# Altium integrated library STM32F417 Demo Board.IntLib: 69 symbols (continued)
## Inductor_1
designator L?, comment value 4.7uH  Saturation Current: 2A  (hidden comment: Inductor)
Manufacturer Part Number: NRS5020T4R7MMGJ; Manufacturer: Taiyo Yuden; ComponentLink1Description: Datasheet; ComponentLink1URL: C:\Users\Public\Documents\Altium\env\Datasheets\Inductor\Taiyo Yuden - NRx Series.pdf; ComponentLink2Description: Supplier Link; ComponentLink2URL: https://www.digikey.com/en/products/detail/taiyo-yuden/NRS5020T4R7MMGJ/2230192; Component Category: Inductor; Component Type: Power Inductor; Supplier Link: https://www.digikey.com/en/products/detail/taiyo-yuden/NRS5020T4R7MMGJ/2230192; Supplier Currency: $; Price, Max: $0.07087; Price, Min: $0.18000; Quantity, Max: 87,750; Quantity, Min: 1; Operating Temperature, Max: +120℃; Operating Temperature, Min: -25℃; Supplier Part Number: 587-2890-1-ND; Supplier: Digikey; Package: 5x5x2 mm
footprint Taiyo Yuden - Power Inductor, 4040TK
footprint Taiyo Yuden - Power Inductor, 5050WK
pins: 1, 2

## Logo
designator Logo?  (value not drawn)  (no BOM)
Component Category: Mechanical; Component Type: Logo
footprint Logo 1 (Logo)
text: LOGO

## Mosfet, N-Channel
designator Q?  Current: 100mA  Voltage: 20V  Package: SOT-416FL, SC-89  (hidden comment: Mosfet, N-Channel)
MOSFET, N-CH, 20V, 100mA, SOT-416FL; Manufacturer Part Number: RE1C001UNTCL; Manufacturer: Rohm; Component Category: Transistor; ComponentLink1Description: Datasheet; ComponentLink1URL: C:\Users\Public\Documents\Altium\env\Datasheets\Transistor\Rohm, RE1C001UN.pdf; ComponentLink2Description: Supplier Link; ComponentLink2URL: https://www.digikey.com/en/products/detail/rohm-semiconductor/RE1C001UNTCL/4004557; Supplier: Digikey; Supplier Part Number: RE1C001UNTCLCT-ND; Operating Temperature, Min: *℃; Operating Temperature, Max: *℃; Quantity, Min: 1; Quantity, Max: 15,000; Price, Min: $0.30000; Price, Max: $0.03713; Supplier Currency: $; Supplier Link: https://www.digikey.com/en/products/detail/rohm-semiconductor/RE1C001UNTCL/4004557; Component Type: Mosfet
footprint SOT-416FL, Mosfet - Type 1
pins: D, G, S
1 alternate drawing of the same symbol

## Nexperia, 74LVC4245A
designator IC?  Manufacturer Part Number: 74LVC4245APW,118  Package: TSSOP-24  (hidden comment: Nexperia, 74LVC4245A)
IC, Buffer, Nexperia, TSSOP-24; ComponentLink1Description: Datasheet; ComponentLink1URL: C:\Users\Public\Documents\Altium\env\Datasheets\IC - Buffer\NXP -74LVC4245A.pdf; ComponentLink2Description: Supplier Link; ComponentLink2URL: https://www.digikey.com/en/products/detail/nexperia-usa-inc/74lvc4245apw-118/1231659; Supplier Part Number: 1727-4308-1-ND; Supplier Link: https://www.digikey.com/en/products/detail/nexperia-usa-inc/74lvc4245apw-118/1231659; Supplier Currency: $; Supplier: Digikey; Quantity, Min: 1; Quantity, Max: 1,000; Price, Min: $0.71000; Price, Max: $0.34850; Operating Temperature, Min: -40℃; Operating Temperature, Max: +125℃; Manufacturer: Nexperia; Component Type: Buffer; Component Category: IC
footprint TSSOP-24
pins: 1 VCCA, 2 DIR, 3 A0, 4 A1, 5 A2, 6 A3, 7 A4, 8 A5, 9 A6, 10 A7, 11 GND, 12 GND, 13 GND, 14 B7, 15 B6, 16 B5, 17 B4, 18 B3, 19 B2, 20 B1, 21 B0, 22 #OE, 23 VCCB, 24 VCCB
text: DIR = 1; DIR = 0; VCCA ≥ VCCB

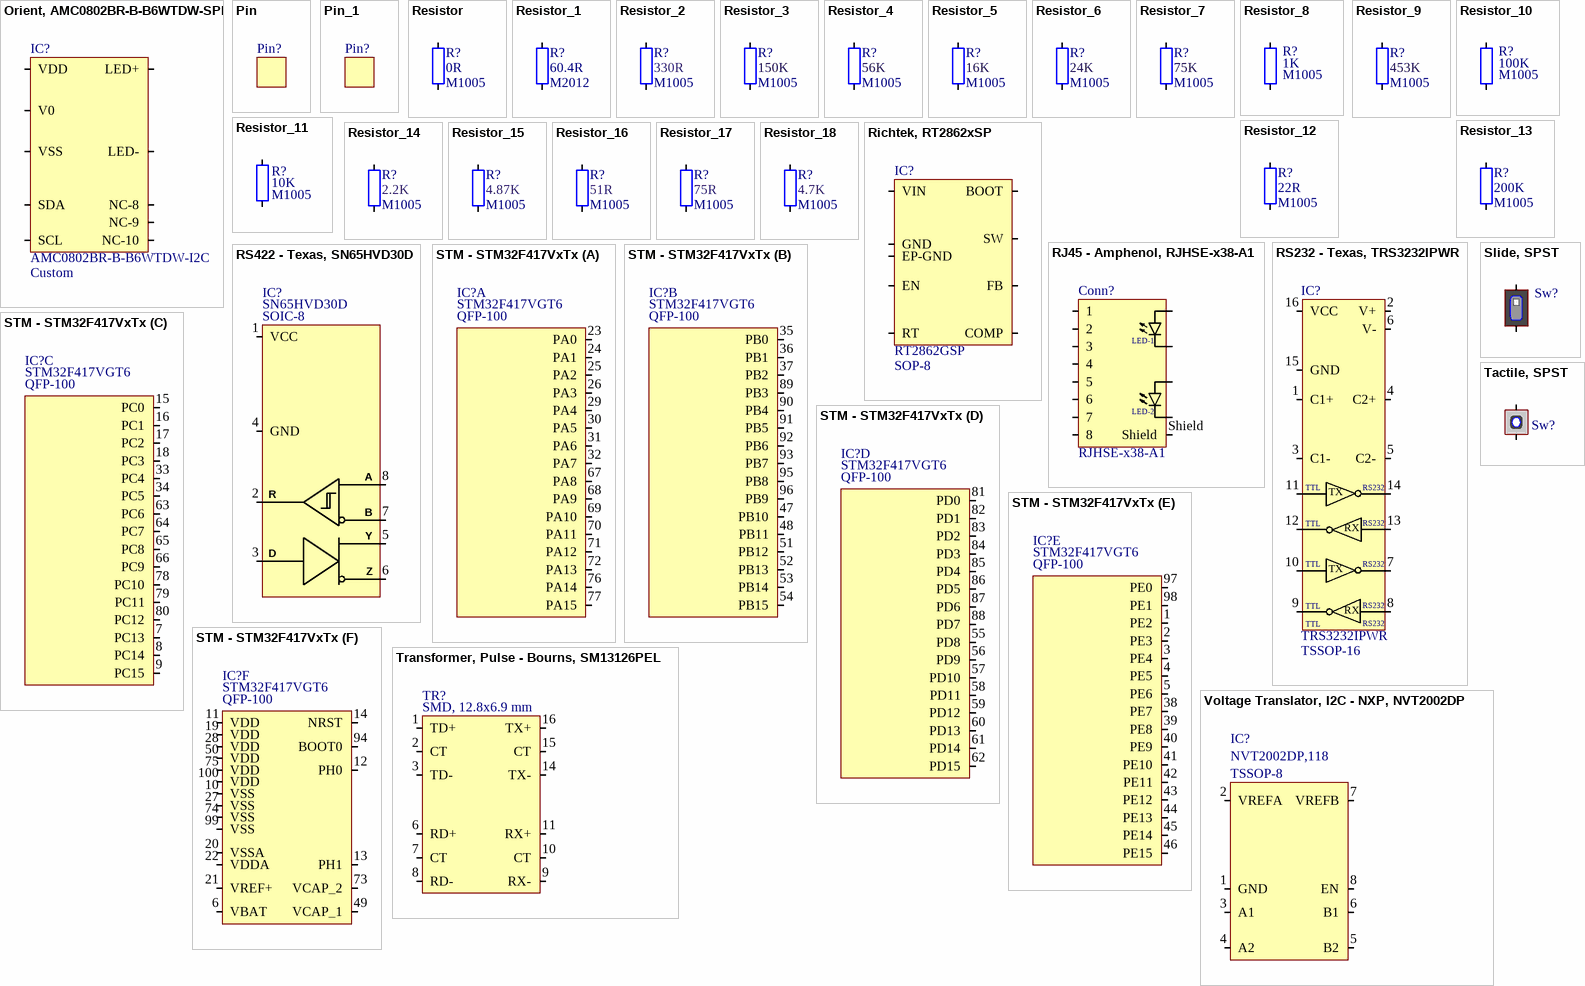
[diagram p1: symbols Orient, AMC0802BR-B-B6WTDW-SPI to Voltage Translator, I2C - NXP, NVT2002DP]

## Orient, AMC0802BR-B-B6WTDW-SPI
designator IC?  Manufacturer Part Number: AMC0802BR-B-B6WTDW-I2C  Package: Custom  (hidden comment: Orient, AMC0802BR-B-B6WTDW-SPI)
Module, LCD, Orient, AMC0802BR-B-B6WTDW-SPI; Manufacturer: Orient Display; ComponentLink1Description: Datasheet; ComponentLink1URL: C:\Users\Public\Documents\Altium\env\Datasheets\Module - LCD\AMC0802BR-B-B6WTDW-SPI.pdf; ComponentLink2Description: Supplier Link; ComponentLink2URL: https://www.digikey.com/en/products/detail/orient-display/amc0802br-b-b6wtdw-i2c/22531884; Supplier Part Number: 5491-AMC0802BR-B-B6WTDW-I2C-ND; Supplier Link: https://www.digikey.com/en/products/detail/orient-display/amc0802br-b-b6wtdw-i2c/22531884; Supplier Currency: $; Supplier: Digikey; Quantity, Min: 1; Quantity, Max: 1,000; Price, Min: $10.32000; Price, Max: $5.74189; Operating Temperature, Min: -20℃; Operating Temperature, Max: +70℃; Component Type: Module; Component Category: LCD
footprint Orient, AMC0802BR-B-B6WTDW-SPI (Module, LCD, Orient, AMC0802BR-B-B6WTDW-SPI)
pins: LED+, LED-, NC-8, NC-9, NC-10, SCL, SDA, V0, VDD, VSS

## Pin
designator Pin?  (value not drawn)
Manufacturer: JST; Manufacturer Part Number: SPND-001T-C0.5; Component Category: Connector; ComponentLink1Description: Datasheet; ComponentLink1URL: C:\Users\Public\Documents\Altium\env\Datasheets\Connector\SPHD-001T-P0.5.pdf; ComponentLink2Description: Supplier Link; ComponentLink2URL: https://www.digikey.com/en/products/detail/jst-sales-america-inc/SPND-001T-C0-5/1788519; Supplier Part Number: 455-2303-1-ND; Supplier Link: https://www.digikey.com/en/products/detail/jst-sales-america-inc/SPND-001T-C0-5/1788519; Supplier Currency: $; Supplier: Digikey; Quantity, Min: 1,000; Quantity, Max: *; Price, Min: $0.02410; Price, Max: $*; Operating Temperature, Min: *℃; Operating Temperature, Max: *℃; Component Type: PCB; Package: Pin
footprint Pin, SPHD-001T-P0.5
footprint Pin, SPND-001T-C0.5
footprint Pin, SXA-001T-P0.6

## Pin_1
designator Pin?, comment Pin  (value not drawn)
Pin, JST, SXA-001T-P0.6; Component Category: Connector; ComponentLink1Description: Datasheet; ComponentLink1URL: C:\Users\Public\Documents\Altium\env\Datasheets\Connector\SPHD-001T-P0.5.pdf; ComponentLink2Description: Supplier Link; ComponentLink2URL: https://www.digikey.com/en/products/detail/jst-sales-america-inc/SXA-001T-P0-6/923775; Supplier Part Number: 455-1904-1-ND; Supplier Link: https://www.digikey.com/en/products/detail/jst-sales-america-inc/SXA-001T-P0-6/923775; Supplier Currency: $; Supplier: Digikey; Quantity, Min: 8,000; Quantity, Max: 800,000; Price, Min: $0.01620; Price, Max: $0.01171; Operating Temperature, Min: *℃; Operating Temperature, Max: *℃; Manufacturer: JST; Component Type: PCB; Package: Housing; Manufacturer Part Number: SXA-001T-P0.6
footprint Pin, SPHD-001T-P0.5
footprint Pin, SPND-001T-C0.5
footprint Pin, SXA-001T-P0.6

## Resistor
designator R?  value 0R  Package: M1005  (hidden comment: Resistor)
Manufacturer: Yageo; Manufacturer Part Number: RC0402FR-070RL; Supplier: Digikey; Supplier Part Number: 311-0.0LRCT-ND; Operating Temperature, Min: -55℃; Operating Temperature, Max: +155℃; Quantity, Min: 1; Quantity, Max: 250000; Price, Min: $0.10000; Price, Max: $0.00133; Supplier Currency: $; Supplier Link: https://www.digikey.com/en/products/detail/yageo/RC0402FR-070RL/2827570; Tolerance: *; Component Type: Fixed Value; Component Category: Resistor; ComponentLink1Description: Datasheet; ComponentLink1URL: C:\Users\Public\Documents\Altium\env\Datasheets\Resistor\Yageo - RC_L Series.pdf; ComponentLink2Description: Supplier Link; ComponentLink2URL: https://www.digikey.com/en/products/detail/yageo/RC0402FR-070RL/2827570
footprint Resistor_SMD_M603_I0201 (Resistor, SMD, M603, I0201)
footprint Resistor_SMD_M1005_I0402 (Resistor, SMD, M1005, I0402)
footprint Resistor_SMD_M1608_I0603 (Resistor, SMD, M1608, I0603)
footprint Resistor_SMD_M2012_I0805 (Resistor, SMD, M2012, I0805)
footprint Resistor_SMD_M3216_I1206 (Resistor, SMD, M3216, I1206)
footprint Resistor_SMD_M5025_I2010 (Resistor, SMD, M5025, I2010)
footprint Resistor_SMD_M6332_I2512 (Resistor, SMD, M1332, I2512)
footprint Resistor_SMD_M3246_I1812 (Resistor, SMD, M3246, I1812)
footprint Resistor_SMD_M3225_I1210 (Resistor, SMD, M3225, I1210)
pins: 1, 2
1 alternate drawing of the same symbol

## Resistor_1
designator R?, comment value 60.4R  Package: M2012  (hidden comment: Resistor)
Res, 60.4R, 1%, M2012; Manufacturer: Yageo; Manufacturer Part Number: RC0805FR-0760R4L; Supplier: Digikey; Supplier Part Number: 311-60.4CRCT-ND; Operating Temperature, Min: -55℃; Operating Temperature, Max: +155℃; Quantity, Min: 1; Quantity, Max: 10,000; Price, Min: $0.10000; Price, Max: $0.00357; Supplier Currency: $; Supplier Link: https://www.digikey.com/en/products/detail/yageo/RC0805FR-0760R4L/728073; Tolerance: 1%; Component Type: Fixed Value; Component Category: Resistor; ComponentLink1Description: Datasheet; ComponentLink1URL: C:\Users\Public\Documents\Altium\env\Datasheets\Resistor\Yageo - RC_L Series.pdf; ComponentLink2Description: Supplier Link; ComponentLink2URL: https://www.digikey.com/en/products/detail/yageo/RC0805FR-0760R4L/728073
footprint Resistor_SMD_M603_I0201 (Resistor, SMD, M603, I0201)
footprint Resistor_SMD_M1005_I0402 (Resistor, SMD, M1005, I0402)
footprint Resistor_SMD_M1608_I0603 (Resistor, SMD, M1608, I0603)
footprint Resistor_SMD_M2012_I0805 (Resistor, SMD, M2012, I0805)
footprint Resistor_SMD_M3216_I1206 (Resistor, SMD, M3216, I1206)
footprint Resistor_SMD_M5025_I2010 (Resistor, SMD, M5025, I2010)
footprint Resistor_SMD_M6332_I2512 (Resistor, SMD, M1332, I2512)
footprint Resistor_SMD_M3246_I1812 (Resistor, SMD, M3246, I1812)
footprint Resistor_SMD_M3225_I1210 (Resistor, SMD, M3225, I1210)
pins: 1, 2
1 alternate drawing of the same symbol

## Resistor_2
designator R?, comment value 330R  Package: M1005  (hidden comment: Resistor)
Res, 330R, 1%, M1005; Manufacturer: Yageo; Manufacturer Part Number: RC0402FR-07330RL; Supplier: Digikey; Supplier Part Number: 311-330LRCT-ND; Operating Temperature, Min: -55℃; Operating Temperature, Max: +155℃; Quantity, Min: 1; Quantity, Max: 250,000; Price, Min: $0.10000; Price, Max: $0.00181; Supplier Currency: $; Supplier Link: https://www.digikey.com/en/products/detail/yageo/RC0402FR-07330RL/726594; Tolerance: 1%; Component Type: Fixed Value; Component Category: Resistor; ComponentLink1Description: Datasheet; ComponentLink1URL: C:\Users\Public\Documents\Altium\env\Datasheets\Resistor\Yageo - RC_L Series.pdf; ComponentLink2Description: Supplier Link; ComponentLink2URL: https://www.digikey.com/en/products/detail/yageo/RC0402FR-07330RL/726594
footprint Resistor_SMD_M603_I0201 (Resistor, SMD, M603, I0201)
footprint Resistor_SMD_M1005_I0402 (Resistor, SMD, M1005, I0402)
footprint Resistor_SMD_M1608_I0603 (Resistor, SMD, M1608, I0603)
footprint Resistor_SMD_M2012_I0805 (Resistor, SMD, M2012, I0805)
footprint Resistor_SMD_M3216_I1206 (Resistor, SMD, M3216, I1206)
footprint Resistor_SMD_M5025_I2010 (Resistor, SMD, M5025, I2010)
footprint Resistor_SMD_M6332_I2512 (Resistor, SMD, M1332, I2512)
footprint Resistor_SMD_M3246_I1812 (Resistor, SMD, M3246, I1812)
footprint Resistor_SMD_M3225_I1210 (Resistor, SMD, M3225, I1210)
pins: 1, 2
1 alternate drawing of the same symbol

## Resistor_3
designator R?, comment value 150K  Package: M1005  (hidden comment: Resistor)
Res, 150K, 1%, M1005; Manufacturer: Yageo; Manufacturer Part Number: RC0402FR-07150KL; Supplier: Digikey; Supplier Part Number: 311-150KLRCT-ND; Operating Temperature, Min: -55℃; Operating Temperature, Max: +155℃; Quantity, Min: 1; Quantity, Max: 250,000; Price, Min: $0.11000; Price, Max: $0.00181; Supplier Currency: $; Supplier Link: https://www.digikey.com/en/products/detail/yageo/RC0402FR-07150KL/726542; Tolerance: 1%; Component Type: Fixed Value; Component Category: Resistor; ComponentLink1Description: Datasheet; ComponentLink1URL: C:\Users\Public\Documents\Altium\env\Datasheets\Resistor\Yageo - RC_L Series.pdf; ComponentLink2Description: Supplier Link; ComponentLink2URL: https://www.digikey.com/en/products/detail/yageo/RC0402FR-07150KL/726542
footprint Resistor_SMD_M603_I0201 (Resistor, SMD, M603, I0201)
footprint Resistor_SMD_M1005_I0402 (Resistor, SMD, M1005, I0402)
footprint Resistor_SMD_M1608_I0603 (Resistor, SMD, M1608, I0603)
footprint Resistor_SMD_M2012_I0805 (Resistor, SMD, M2012, I0805)
footprint Resistor_SMD_M3216_I1206 (Resistor, SMD, M3216, I1206)
footprint Resistor_SMD_M5025_I2010 (Resistor, SMD, M5025, I2010)
footprint Resistor_SMD_M6332_I2512 (Resistor, SMD, M1332, I2512)
footprint Resistor_SMD_M3246_I1812 (Resistor, SMD, M3246, I1812)
footprint Resistor_SMD_M3225_I1210 (Resistor, SMD, M3225, I1210)
pins: 1, 2
1 alternate drawing of the same symbol

## Resistor_4
designator R?, comment value 56K  Package: M1005  (hidden comment: Resistor)
Res, 56K, 1%, M1005; Manufacturer: Yageo; Manufacturer Part Number: RC0402FR-0756KL; Supplier: Digikey; Supplier Part Number: 311-56.0KLRCT-ND; Operating Temperature, Min: -55℃; Operating Temperature, Max: +155℃; Quantity, Min: 1; Quantity, Max: 250,000; Price, Min: $0.10000; Price, Max: $0.00181; Supplier Currency: $; Supplier Link: https://www.digikey.com/en/products/detail/yageo/RC0402FR-0756KL/726635; Tolerance: 1%; Component Type: Fixed Value; Component Category: Resistor; ComponentLink1Description: Datasheet; ComponentLink1URL: C:\Users\Public\Documents\Altium\env\Datasheets\Resistor\Yageo - RC_L Series.pdf; ComponentLink2Description: Supplier Link; ComponentLink2URL: https://www.digikey.com/en/products/detail/yageo/RC0402FR-0756KL/726635
footprint Resistor_SMD_M603_I0201 (Resistor, SMD, M603, I0201)
footprint Resistor_SMD_M1005_I0402 (Resistor, SMD, M1005, I0402)
footprint Resistor_SMD_M1608_I0603 (Resistor, SMD, M1608, I0603)
footprint Resistor_SMD_M2012_I0805 (Resistor, SMD, M2012, I0805)
footprint Resistor_SMD_M3216_I1206 (Resistor, SMD, M3216, I1206)
footprint Resistor_SMD_M5025_I2010 (Resistor, SMD, M5025, I2010)
footprint Resistor_SMD_M6332_I2512 (Resistor, SMD, M1332, I2512)
footprint Resistor_SMD_M3246_I1812 (Resistor, SMD, M3246, I1812)
footprint Resistor_SMD_M3225_I1210 (Resistor, SMD, M3225, I1210)
pins: 1, 2
1 alternate drawing of the same symbol

## Resistor_5
designator R?, comment value 16K  Package: M1005  (hidden comment: Resistor)
Res, 16K, 1%, M1005; Manufacturer: Yageo; Manufacturer Part Number: RC0402FR-0716KL; Supplier: Digikey; Supplier Part Number: 311-16.0KLRCT-ND; Operating Temperature, Min: -55℃; Operating Temperature, Max: +155℃; Quantity, Min: 1; Quantity, Max: 10,000; Price, Min: $0.10000; Price, Max: $0.00127; Supplier Currency: $; Supplier Link: https://www.digikey.com/en/products/detail/yageo/RC0402FR-0716KL/726544; Tolerance: 1%; Component Type: Fixed Value; Component Category: Resistor; ComponentLink1Description: Datasheet; ComponentLink1URL: C:\Users\Public\Documents\Altium\env\Datasheets\Resistor\Yageo - RC_L Series.pdf; ComponentLink2Description: Supplier Link; ComponentLink2URL: https://www.digikey.com/en/products/detail/yageo/RC0402FR-0716KL/726544
footprint Resistor_SMD_M603_I0201 (Resistor, SMD, M603, I0201)
footprint Resistor_SMD_M1005_I0402 (Resistor, SMD, M1005, I0402)
footprint Resistor_SMD_M1608_I0603 (Resistor, SMD, M1608, I0603)
footprint Resistor_SMD_M2012_I0805 (Resistor, SMD, M2012, I0805)
footprint Resistor_SMD_M3216_I1206 (Resistor, SMD, M3216, I1206)
footprint Resistor_SMD_M5025_I2010 (Resistor, SMD, M5025, I2010)
footprint Resistor_SMD_M6332_I2512 (Resistor, SMD, M1332, I2512)
footprint Resistor_SMD_M3246_I1812 (Resistor, SMD, M3246, I1812)
footprint Resistor_SMD_M3225_I1210 (Resistor, SMD, M3225, I1210)
pins: 1, 2
1 alternate drawing of the same symbol

## Resistor_6
designator R?, comment value 24K  Package: M1005  (hidden comment: Resistor)
Res, 24K, 1%, M1005; Manufacturer: Yageo; Manufacturer Part Number: RC0402FR-0724KL; Supplier: Digikey; Supplier Part Number: 311-24KLRCT-ND; Operating Temperature, Min: -55℃; Operating Temperature, Max: +155℃; Quantity, Min: 1; Quantity, Max: 20,000; Price, Min: $0.10000; Price, Max: $0.00153; Supplier Currency: $; Supplier Link: https://www.digikey.com/en/products/detail/yageo/RC0402FR-0724KL/2827581; Tolerance: 1%; Component Type: Fixed Value; Component Category: Resistor; ComponentLink1Description: Datasheet; ComponentLink1URL: C:\Users\Public\Documents\Altium\env\Datasheets\Resistor\Yageo - RC_L Series.pdf; ComponentLink2Description: Supplier Link; ComponentLink2URL: https://www.digikey.com/en/products/detail/yageo/RC0402FR-0724KL/2827581
footprint Resistor_SMD_M603_I0201 (Resistor, SMD, M603, I0201)
footprint Resistor_SMD_M1005_I0402 (Resistor, SMD, M1005, I0402)
footprint Resistor_SMD_M1608_I0603 (Resistor, SMD, M1608, I0603)
footprint Resistor_SMD_M2012_I0805 (Resistor, SMD, M2012, I0805)
footprint Resistor_SMD_M3216_I1206 (Resistor, SMD, M3216, I1206)
footprint Resistor_SMD_M5025_I2010 (Resistor, SMD, M5025, I2010)
footprint Resistor_SMD_M6332_I2512 (Resistor, SMD, M1332, I2512)
footprint Resistor_SMD_M3246_I1812 (Resistor, SMD, M3246, I1812)
footprint Resistor_SMD_M3225_I1210 (Resistor, SMD, M3225, I1210)
pins: 1, 2
1 alternate drawing of the same symbol

## Resistor_7
designator R?, comment value 75K  Package: M1005  (hidden comment: Resistor)
Res, 75K, 1%, M1005; Manufacturer: Yageo; Manufacturer Part Number: RC0402FR-0775KL; Supplier: Digikey; Supplier Part Number: 311-75KLRCT-ND; Operating Temperature, Min: -55℃; Operating Temperature, Max: +155℃; Quantity, Min: 1; Quantity, Max: 250,000; Price, Min: $0.10000; Price, Max: $0.00181; Supplier Currency: $; Supplier Link: https://www.digikey.com/en/products/detail/yageo/RC0402FR-0775KL/2827576; Tolerance: 1%; Component Type: Fixed Value; Component Category: Resistor; ComponentLink1Description: Datasheet; ComponentLink1URL: C:\Users\Public\Documents\Altium\env\Datasheets\Resistor\Yageo - RC_L Series.pdf; ComponentLink2Description: Supplier Link; ComponentLink2URL: https://www.digikey.com/en/products/detail/yageo/RC0402FR-0775KL/2827576
footprint Resistor_SMD_M603_I0201 (Resistor, SMD, M603, I0201)
footprint Resistor_SMD_M1005_I0402 (Resistor, SMD, M1005, I0402)
footprint Resistor_SMD_M1608_I0603 (Resistor, SMD, M1608, I0603)
footprint Resistor_SMD_M2012_I0805 (Resistor, SMD, M2012, I0805)
footprint Resistor_SMD_M3216_I1206 (Resistor, SMD, M3216, I1206)
footprint Resistor_SMD_M5025_I2010 (Resistor, SMD, M5025, I2010)
footprint Resistor_SMD_M6332_I2512 (Resistor, SMD, M1332, I2512)
footprint Resistor_SMD_M3246_I1812 (Resistor, SMD, M3246, I1812)
footprint Resistor_SMD_M3225_I1210 (Resistor, SMD, M3225, I1210)
pins: 1, 2
1 alternate drawing of the same symbol

## Resistor_8
designator R?, comment value 1K  Package: M1005  (hidden comment: Resistor)
Res, 1K, 1%, M1005; Manufacturer: Yageo; Manufacturer Part Number: RC0402FR-071KP; Supplier: Digikey; Supplier Part Number: YAG1254CT-ND; Operating Temperature, Min: -55℃; Operating Temperature, Max: +155℃; Quantity, Min: 1; Quantity, Max: 10,000; Price, Min: $0.10000; Price, Max: $0.00306; Supplier Currency: $; Supplier Link: https://www.digikey.com/en/products/detail/yageo/RC0402FR-071KP/4935269; Tolerance: 1%; Component Type: Fixed Value; Component Category: Resistor; ComponentLink1Description: Datasheet; ComponentLink1URL: C:\Users\Public\Documents\Altium\env\Datasheets\Resistor\Yageo - RC_L Series.pdf; ComponentLink2Description: Supplier Link; ComponentLink2URL: https://www.digikey.com/en/products/detail/yageo/RC0402FR-071KP/4935269
footprint Resistor_SMD_M603_I0201 (Resistor, SMD, M603, I0201)
footprint Resistor_SMD_M1005_I0402 (Resistor, SMD, M1005, I0402)
footprint Resistor_SMD_M1608_I0603 (Resistor, SMD, M1608, I0603)
footprint Resistor_SMD_M2012_I0805 (Resistor, SMD, M2012, I0805)
footprint Resistor_SMD_M3216_I1206 (Resistor, SMD, M3216, I1206)
footprint Resistor_SMD_M5025_I2010 (Resistor, SMD, M5025, I2010)
footprint Resistor_SMD_M6332_I2512 (Resistor, SMD, M1332, I2512)
footprint Resistor_SMD_M3246_I1812 (Resistor, SMD, M3246, I1812)
footprint Resistor_SMD_M3225_I1210 (Resistor, SMD, M3225, I1210)
pins: 1, 2
1 alternate drawing of the same symbol

## Resistor_9
designator R?, comment value 453K  Package: M1005  (hidden comment: Resistor)
Res, 453K, 1%, M1005; Manufacturer: Yageo; Manufacturer Part Number: RC0402FR-07453KL; Supplier: Digikey; Supplier Part Number: YAG3164CT-ND; Operating Temperature, Min: -55℃; Operating Temperature, Max: +155℃; Quantity, Min: 1; Quantity, Max: 10,000; Price, Min: $0.10000; Price, Max: $0.00127; Supplier Currency: $; Supplier Link: https://www.digikey.com/en/products/detail/yageo/RC0402FR-07453KL/5281024; Tolerance: 1%; Component Type: Fixed Value; Component Category: Resistor; ComponentLink1Description: Datasheet; ComponentLink1URL: C:\Users\Public\Documents\Altium\env\Datasheets\Resistor\Yageo - RC_L Series.pdf; ComponentLink2Description: Supplier Link; ComponentLink2URL: https://www.digikey.com/en/products/detail/yageo/RC0402FR-07453KL/5281024
footprint Resistor_SMD_M603_I0201 (Resistor, SMD, M603, I0201)
footprint Resistor_SMD_M1005_I0402 (Resistor, SMD, M1005, I0402)
footprint Resistor_SMD_M1608_I0603 (Resistor, SMD, M1608, I0603)
footprint Resistor_SMD_M2012_I0805 (Resistor, SMD, M2012, I0805)
footprint Resistor_SMD_M3216_I1206 (Resistor, SMD, M3216, I1206)
footprint Resistor_SMD_M5025_I2010 (Resistor, SMD, M5025, I2010)
footprint Resistor_SMD_M6332_I2512 (Resistor, SMD, M1332, I2512)
footprint Resistor_SMD_M3246_I1812 (Resistor, SMD, M3246, I1812)
footprint Resistor_SMD_M3225_I1210 (Resistor, SMD, M3225, I1210)
pins: 1, 2
1 alternate drawing of the same symbol

## Resistor_10
designator R?, comment value 100K  Package: M1005  (hidden comment: Resistor)
Res, 100K, 1%, M1005; Manufacturer: Yageo; Manufacturer Part Number: RC0402FR-07100KP; Supplier: Digikey; Supplier Part Number: 13-RC0402FR-07100KPCT-ND; Operating Temperature, Min: -55℃; Operating Temperature, Max: +155℃; Quantity, Min: 1; Quantity, Max: 10,000; Price, Min: $0.12000; Price, Max: $0.00306; Supplier Currency: $; Supplier Link: https://www.digikey.com/en/products/detail/yageo/RC0402FR-07100KP/12698883; Tolerance: 1%; Component Type: Fixed Value; Component Category: Resistor; ComponentLink1Description: Datasheet; ComponentLink1URL: C:\Users\Public\Documents\Altium\env\Datasheets\Resistor\Yageo - RC_L Series.pdf; ComponentLink2Description: Supplier Link; ComponentLink2URL: https://www.digikey.com/en/products/detail/yageo/RC0402FR-07100KP/12698883
footprint Resistor_SMD_M603_I0201 (Resistor, SMD, M603, I0201)
footprint Resistor_SMD_M1005_I0402 (Resistor, SMD, M1005, I0402)
footprint Resistor_SMD_M1608_I0603 (Resistor, SMD, M1608, I0603)
footprint Resistor_SMD_M2012_I0805 (Resistor, SMD, M2012, I0805)
footprint Resistor_SMD_M3216_I1206 (Resistor, SMD, M3216, I1206)
footprint Resistor_SMD_M5025_I2010 (Resistor, SMD, M5025, I2010)
footprint Resistor_SMD_M6332_I2512 (Resistor, SMD, M1332, I2512)
footprint Resistor_SMD_M3246_I1812 (Resistor, SMD, M3246, I1812)
footprint Resistor_SMD_M3225_I1210 (Resistor, SMD, M3225, I1210)
pins: 1, 2
1 alternate drawing of the same symbol

## Resistor_11
designator R?, comment value 10K  Package: M1005  (hidden comment: Resistor)
Res, 10K, 1%, M1005; Manufacturer: Yageo; Manufacturer Part Number: RC0402FR-0710KP; Supplier: Digikey; Supplier Part Number: YAG1249CT-ND; Operating Temperature, Min: -55℃; Operating Temperature, Max: +155℃; Quantity, Min: 1; Quantity, Max: 250,000; Price, Min: $0.11000; Price, Max: $0.00359; Supplier Currency: $; Supplier Link: https://www.digikey.com/en/products/detail/yageo/RC0402FR-0710KP/4935264; Tolerance: 1%; Component Type: Fixed Value; Component Category: Resistor; ComponentLink1Description: Datasheet; ComponentLink1URL: C:\Users\Public\Documents\Altium\env\Datasheets\Resistor\Yageo - RC_L Series.pdf; ComponentLink2Description: Supplier Link; ComponentLink2URL: https://www.digikey.com/en/products/detail/yageo/RC0402FR-0710KP/4935264
footprint Resistor_SMD_M603_I0201 (Resistor, SMD, M603, I0201)
footprint Resistor_SMD_M1005_I0402 (Resistor, SMD, M1005, I0402)
footprint Resistor_SMD_M1608_I0603 (Resistor, SMD, M1608, I0603)
footprint Resistor_SMD_M2012_I0805 (Resistor, SMD, M2012, I0805)
footprint Resistor_SMD_M3216_I1206 (Resistor, SMD, M3216, I1206)
footprint Resistor_SMD_M5025_I2010 (Resistor, SMD, M5025, I2010)
footprint Resistor_SMD_M6332_I2512 (Resistor, SMD, M1332, I2512)
footprint Resistor_SMD_M3246_I1812 (Resistor, SMD, M3246, I1812)
footprint Resistor_SMD_M3225_I1210 (Resistor, SMD, M3225, I1210)
pins: 1, 2
1 alternate drawing of the same symbol

## Resistor_12
designator R?, comment value 22R  Package: M1005  (hidden comment: Resistor)
Res, 22R, 1%, M1005; Manufacturer: Yageo; Manufacturer Part Number: RC0402FR-0722RL; Supplier: Digikey; Supplier Part Number: 311-22.0LRCT-ND; Operating Temperature, Min: -55℃; Operating Temperature, Max: +155℃; Quantity, Min: 1; Quantity, Max: 70,000; Price, Min: $0.10000; Price, Max: $0.00181; Supplier Currency: $; Supplier Link: https://www.digikey.com/en/products/detail/yageo/RC0402FR-0722RL/726562; Tolerance: 1%; Component Type: Fixed Value; Component Category: Resistor; ComponentLink1Description: Datasheet; ComponentLink1URL: C:\Users\Public\Documents\Altium\env\Datasheets\Resistor\Yageo - RC_L Series.pdf; ComponentLink2Description: Supplier Link; ComponentLink2URL: https://www.digikey.com/en/products/detail/yageo/RC0402FR-0722RL/726562
footprint Resistor_SMD_M603_I0201 (Resistor, SMD, M603, I0201)
footprint Resistor_SMD_M1005_I0402 (Resistor, SMD, M1005, I0402)
footprint Resistor_SMD_M1608_I0603 (Resistor, SMD, M1608, I0603)
footprint Resistor_SMD_M2012_I0805 (Resistor, SMD, M2012, I0805)
footprint Resistor_SMD_M3216_I1206 (Resistor, SMD, M3216, I1206)
footprint Resistor_SMD_M5025_I2010 (Resistor, SMD, M5025, I2010)
footprint Resistor_SMD_M6332_I2512 (Resistor, SMD, M1332, I2512)
footprint Resistor_SMD_M3246_I1812 (Resistor, SMD, M3246, I1812)
footprint Resistor_SMD_M3225_I1210 (Resistor, SMD, M3225, I1210)
pins: 1, 2
1 alternate drawing of the same symbol

## Resistor_13
designator R?, comment value 200K  Package: M1005  (hidden comment: Resistor)
Res, 200K, 1%, M1005; Manufacturer: Yageo; Manufacturer Part Number: RC0402FR-07200KL; Supplier: Digikey; Supplier Part Number: 311-200KLRCT-ND; Operating Temperature, Min: -55℃; Operating Temperature, Max: +155℃; Quantity, Min: *; Quantity, Max: *; Price, Min: *; Price, Max: *; Supplier Currency: $; Supplier Link: https://www.digikey.com/en/products/detail/yageo/RC0402FR-07200KL/726558; Tolerance: 1%; Component Type: Fixed Value; Component Category: Resistor; ComponentLink1Description: Datasheet; ComponentLink1URL: C:\Users\Public\Documents\Altium\env\Datasheets\Resistor\Yageo - RC_L Series.pdf; ComponentLink2Description: Supplier Link; ComponentLink2URL: https://www.digikey.com/en/products/detail/yageo/RC0402FR-07200KL/726558
footprint Resistor_SMD_M603_I0201 (Resistor, SMD, M603, I0201)
footprint Resistor_SMD_M1005_I0402 (Resistor, SMD, M1005, I0402)
footprint Resistor_SMD_M1608_I0603 (Resistor, SMD, M1608, I0603)
footprint Resistor_SMD_M2012_I0805 (Resistor, SMD, M2012, I0805)
footprint Resistor_SMD_M3216_I1206 (Resistor, SMD, M3216, I1206)
footprint Resistor_SMD_M5025_I2010 (Resistor, SMD, M5025, I2010)
footprint Resistor_SMD_M6332_I2512 (Resistor, SMD, M1332, I2512)
footprint Resistor_SMD_M3246_I1812 (Resistor, SMD, M3246, I1812)
footprint Resistor_SMD_M3225_I1210 (Resistor, SMD, M3225, I1210)
pins: 1, 2
1 alternate drawing of the same symbol

## Resistor_14
designator R?, comment value 2.2K  Package: M1005  (hidden comment: Resistor)
Res, 2.2K, 1%, M1005; Manufacturer: Yageo; Manufacturer Part Number: RC0402FR-072K2L; Supplier: Digikey; Supplier Part Number: 311-2.20KLRCT-ND; Operating Temperature, Min: -55℃; Operating Temperature, Max: +155℃; Quantity, Min: 1; Quantity, Max: 70,000; Price, Min: $0.10000; Price, Max: $0.00181; Supplier Currency: $; Supplier Link: https://www.digikey.com/en/products/detail/yageo/RC0402FR-072K2L/726553; Tolerance: 1%; Component Type: Fixed Value; Component Category: Resistor; ComponentLink1Description: Datasheet; ComponentLink1URL: C:\Users\Public\Documents\Altium\env\Datasheets\Resistor\Yageo - RC_L Series.pdf; ComponentLink2Description: Supplier Link; ComponentLink2URL: https://www.digikey.com/en/products/detail/yageo/RC0402FR-072K2L/726553
footprint Resistor_SMD_M603_I0201 (Resistor, SMD, M603, I0201)
footprint Resistor_SMD_M1005_I0402 (Resistor, SMD, M1005, I0402)
footprint Resistor_SMD_M1608_I0603 (Resistor, SMD, M1608, I0603)
footprint Resistor_SMD_M2012_I0805 (Resistor, SMD, M2012, I0805)
footprint Resistor_SMD_M3216_I1206 (Resistor, SMD, M3216, I1206)
footprint Resistor_SMD_M5025_I2010 (Resistor, SMD, M5025, I2010)
footprint Resistor_SMD_M6332_I2512 (Resistor, SMD, M1332, I2512)
footprint Resistor_SMD_M3246_I1812 (Resistor, SMD, M3246, I1812)
footprint Resistor_SMD_M3225_I1210 (Resistor, SMD, M3225, I1210)
pins: 1, 2
1 alternate drawing of the same symbol

## Resistor_15
designator R?, comment value 4.87K  Package: M1005  (hidden comment: Resistor)
Res, 4.87K, 1%, M1005; Manufacturer: Yageo; Manufacturer Part Number: RC0402FR-074K87L; Supplier: Digikey; Supplier Part Number: YAG3175CT-ND; Operating Temperature, Min: -55℃; Operating Temperature, Max: +155℃; Quantity, Min: 1; Quantity, Max: 70,000; Price, Min: $0.10000; Price, Max: $0.00181; Supplier Currency: $; Supplier Link: https://www.digikey.com/en/products/detail/yageo/RC0402FR-074K87L/5281035; Tolerance: 1%; Component Type: Fixed Value; Component Category: Resistor; ComponentLink1Description: Datasheet; ComponentLink1URL: C:\Users\Public\Documents\Altium\env\Datasheets\Resistor\Yageo - RC_L Series.pdf; ComponentLink2Description: Supplier Link; ComponentLink2URL: https://www.digikey.com/en/products/detail/yageo/RC0402FR-074K87L/5281035
footprint Resistor_SMD_M603_I0201 (Resistor, SMD, M603, I0201)
footprint Resistor_SMD_M1005_I0402 (Resistor, SMD, M1005, I0402)
footprint Resistor_SMD_M1608_I0603 (Resistor, SMD, M1608, I0603)
footprint Resistor_SMD_M2012_I0805 (Resistor, SMD, M2012, I0805)
footprint Resistor_SMD_M3216_I1206 (Resistor, SMD, M3216, I1206)
footprint Resistor_SMD_M5025_I2010 (Resistor, SMD, M5025, I2010)
footprint Resistor_SMD_M6332_I2512 (Resistor, SMD, M1332, I2512)
footprint Resistor_SMD_M3246_I1812 (Resistor, SMD, M3246, I1812)
footprint Resistor_SMD_M3225_I1210 (Resistor, SMD, M3225, I1210)
pins: 1, 2
1 alternate drawing of the same symbol

## Resistor_16
designator R?, comment value 51R  Package: M1005  (hidden comment: Resistor)
Res, 51R, 1%, M1005; Manufacturer: Yageo; Manufacturer Part Number: RC0402FR-0751RL; Supplier: Digikey; Supplier Part Number: 311-51.0LRCT-ND; Operating Temperature, Min: -55℃; Operating Temperature, Max: +155℃; Quantity, Min: 1; Quantity, Max: 70,000; Price, Min: $0.10000; Price, Max: $0.00181; Supplier Currency: $; Supplier Link: https://www.digikey.com/en/products/detail/yageo/RC0402FR-0751RL/726629; Tolerance: 1%; Component Type: Fixed Value; Component Category: Resistor; ComponentLink1Description: Datasheet; ComponentLink1URL: C:\Users\Public\Documents\Altium\env\Datasheets\Resistor\Yageo - RC_L Series.pdf; ComponentLink2Description: Supplier Link; ComponentLink2URL: https://www.digikey.com/en/products/detail/yageo/RC0402FR-0751RL/726629
footprint Resistor_SMD_M603_I0201 (Resistor, SMD, M603, I0201)
footprint Resistor_SMD_M1005_I0402 (Resistor, SMD, M1005, I0402)
footprint Resistor_SMD_M1608_I0603 (Resistor, SMD, M1608, I0603)
footprint Resistor_SMD_M2012_I0805 (Resistor, SMD, M2012, I0805)
footprint Resistor_SMD_M3216_I1206 (Resistor, SMD, M3216, I1206)
footprint Resistor_SMD_M5025_I2010 (Resistor, SMD, M5025, I2010)
footprint Resistor_SMD_M6332_I2512 (Resistor, SMD, M1332, I2512)
footprint Resistor_SMD_M3246_I1812 (Resistor, SMD, M3246, I1812)
footprint Resistor_SMD_M3225_I1210 (Resistor, SMD, M3225, I1210)
pins: 1, 2
1 alternate drawing of the same symbol

## Resistor_17
designator R?, comment value 75R  Package: M1005  (hidden comment: Resistor)
Res, 75R, 1%, M1005; Manufacturer: Yageo; Manufacturer Part Number: RC0402FR-0775RL; Supplier: Digikey; Supplier Part Number: 311-75.0LRCT-ND; Operating Temperature, Min: -55℃; Operating Temperature, Max: +155℃; Quantity, Min: 1; Quantity, Max: 10,000; Price, Min: $0.12000; Price, Max: $0.00306; Supplier Currency: $; Supplier Link: https://www.digikey.com/en/products/detail/yageo/RC0402FR-0775RL/726658; Tolerance: 1%; Component Type: Fixed Value; Component Category: Resistor; ComponentLink1Description: Datasheet; ComponentLink1URL: C:\Users\Public\Documents\Altium\env\Datasheets\Resistor\Yageo - RC_L Series.pdf; ComponentLink2Description: Supplier Link; ComponentLink2URL: https://www.digikey.com/en/products/detail/yageo/RC0402FR-0775RL/726658
footprint Resistor_SMD_M603_I0201 (Resistor, SMD, M603, I0201)
footprint Resistor_SMD_M1005_I0402 (Resistor, SMD, M1005, I0402)
footprint Resistor_SMD_M1608_I0603 (Resistor, SMD, M1608, I0603)
footprint Resistor_SMD_M2012_I0805 (Resistor, SMD, M2012, I0805)
footprint Resistor_SMD_M3216_I1206 (Resistor, SMD, M3216, I1206)
footprint Resistor_SMD_M5025_I2010 (Resistor, SMD, M5025, I2010)
footprint Resistor_SMD_M6332_I2512 (Resistor, SMD, M1332, I2512)
footprint Resistor_SMD_M3246_I1812 (Resistor, SMD, M3246, I1812)
footprint Resistor_SMD_M3225_I1210 (Resistor, SMD, M3225, I1210)
pins: 1, 2
1 alternate drawing of the same symbol

## Resistor_18
designator R?, comment value 4.7K  Package: M1005  (hidden comment: Resistor)
Res, 4.7K, 1%, M1005; Manufacturer: Yageo; Manufacturer Part Number: RC0402FR-074K7L; Supplier: Digikey; Supplier Part Number: 311-4.7KLRCT-ND; Operating Temperature, Min: -55℃; Operating Temperature, Max: +155℃; Quantity, Min: 1; Quantity, Max: 10,000; Price, Min: $0.10000; Price, Max: $0.00204; Supplier Currency: $; Supplier Link: https://www.digikey.com/en/products/detail/yageo/RC0402FR-074K7L/2827563; Tolerance: 1%; Component Type: Fixed Value; Component Category: Resistor; ComponentLink1Description: Datasheet; ComponentLink1URL: C:\Users\Public\Documents\Altium\env\Datasheets\Resistor\Yageo - RC_L Series.pdf; ComponentLink2Description: Supplier Link; ComponentLink2URL: https://www.digikey.com/en/products/detail/yageo/RC0402FR-074K7L/2827563
footprint Resistor_SMD_M603_I0201 (Resistor, SMD, M603, I0201)
footprint Resistor_SMD_M1005_I0402 (Resistor, SMD, M1005, I0402)
footprint Resistor_SMD_M1608_I0603 (Resistor, SMD, M1608, I0603)
footprint Resistor_SMD_M2012_I0805 (Resistor, SMD, M2012, I0805)
footprint Resistor_SMD_M3216_I1206 (Resistor, SMD, M3216, I1206)
footprint Resistor_SMD_M5025_I2010 (Resistor, SMD, M5025, I2010)
footprint Resistor_SMD_M6332_I2512 (Resistor, SMD, M1332, I2512)
footprint Resistor_SMD_M3246_I1812 (Resistor, SMD, M3246, I1812)
footprint Resistor_SMD_M3225_I1210 (Resistor, SMD, M3225, I1210)
pins: 1, 2
1 alternate drawing of the same symbol

## Richtek, RT2862xSP
designator IC?  Manufacturer Part Number: RT2862GSP  Package: SOP-8  (hidden comment: Richtek, RT2862xSP)
IC, Power, DC-DC, Richtek, RT2862xSP; ComponentLink1Description: Datasheet; ComponentLink1URL: C:\Users\Public\Documents\Altium\env\Datasheets\IC - Power - DC-DC\Richtek, RT2862.pdf; ComponentLink2Description: Supplier Link; ComponentLink2URL: https://www.digikey.com/en/products/detail/richtek-usa-inc/rt2862gsp/5880463; Supplier Part Number: 1028-1373-1-ND; Supplier Link: https://www.digikey.com/en/products/detail/richtek-usa-inc/rt2862gsp/5880463; Supplier Currency: $; Supplier: Digikey; Quantity, Min: 1; Quantity, Max: 7,500; Price, Min: $1.79000; Price, Max: $0.87336; Operating Temperature, Min: -40℃; Operating Temperature, Max: +85℃; Manufacturer: Richtek; Component Type: IC; Component Category: Power
footprint Richtek, RT2862xSP, SOP-8 (Richtek, RT2862xSP, SOP, 8Pin)
pins: 1-SW SW, 2-BOOT BOOT, 3-EN EN, 4-GND GND, 5-FB FB, 6-COMP COMP, 7-RT RT, 8-VIN VIN, EP-GND

## RJ45 - Amphenol, RJHSE-x38-A1
designator Conn?  Manufacturer Part Number: RJHSE-x38-A1  (hidden comment: RJ45 - Amphenol, RJHSE-x38-A1)
Component Category: Connector; ComponentLink1Description: Datasheet; ComponentLink1URL: C:\Users\Public\Documents\Altium\env\Datasheets\Connector\RJ45 - Amphenol.pdf; ComponentLink2Description: Supplier Link; ComponentLink2URL: https://www.digikey.com/en/products/detail/amphenol-icc-commercial-products/rjhse5381a1/3083556; Supplier Part Number: RJHSE5381A1-ND; Supplier Link: https://www.digikey.com/en/products/detail/amphenol-icc-commercial-products/rjhse5381a1/3083556; Supplier Currency: $; Supplier: Digikey; Quantity, Min: 1; Quantity, Max: 2,520; Price, Min: $1.90000; Price, Max: $1.09002; Operating Temperature, Min: -55℃; Operating Temperature, Max: +85℃; Manufacturer: Amphenol; Component Type: Registered Jack; Package: RJ45
footprint RJ45 - Amphenol, RJHSE-x38-A1
pins: 1, 2, 3, 4, 5, 6, 7, 8, L1-A, L1-C, L2-A, L2-C, Shield
text: LED-1; LED-2

## RS232 - Texas, TRS3232IPWR
designator IC?  Manufacturer Part Number: TRS3232IPWR  Package: TSSOP-16  (hidden comment: RS232 - Texas, TRS3232IPWR)
IC, Interface, RS232, Texas; Manufacturer: Texas Instruments; ComponentLink1Description: Datasheet; ComponentLink1URL: C:\Users\Public\Documents\Altium\env\Datasheets\IC - Interface\Texas, TRS3232IPWR.pdf; ComponentLink2Description: Supplier Link; ComponentLink2URL: https://www.digikey.com/en/products/detail/texas-instruments/trs3232ipwr/1909117; Supplier Part Number: 296-25041-1-ND; Supplier Link: https://www.digikey.com/en/products/detail/texas-instruments/trs3232ipwr/1909117; Supplier Currency: $; Supplier: Digikey; Quantity, Min: 1; Quantity, Max: 1,000; Price, Min: $1.73000; Price, Max: $0.90061; Operating Temperature, Min: -40℃; Operating Temperature, Max: +85℃; Component Type: Interface; Component Category: IC
footprint TSSOP-16
pins: 1 C1+, 2 V+, 3 C1-, 4 C2+, 5 C2-, 6 V-, 7 DOUT2, 8 RIN2, 9 ROUT2, 10 DIN2, 11 DIN1, 12 ROUT1, 13 RIN1, 14 DOUT1, 15 GND, 16 VCC
text: TTL; RS232; TX; RX

## RS422 - Texas, SN65HVD30D
designator IC?  Manufacturer Part Number: SN65HVD30D  Package: SOIC-8  (hidden comment: RS422 - Texas, SN65HVD30D)
IC, Interface, RS422, Texas; Manufacturer: Texas Instruments; ComponentLink1Description: Datasheet; ComponentLink1URL: C:\Users\Public\Documents\Altium\env\Datasheets\IC - Interface\RS422 - Texas, SN65HVD30D.pdf; ComponentLink2Description: Supplier Link; ComponentLink2URL: https://www.digikey.com/en/products/detail/texas-instruments/sn65hvd30d/1574539; Supplier Part Number: 296-26346-5-ND; Supplier Link: https://www.digikey.com/en/products/detail/texas-instruments/sn65hvd30d/1574539; Supplier Currency: $; Supplier: Digikey; Quantity, Min: *; Quantity, Max: *; Price, Min: *; Price, Max: *; Operating Temperature, Min: -40℃; Operating Temperature, Max: +85℃; Component Type: Interface; Component Category: IC
footprint SOIC-8, NB
pins: 1 VCC, 2 R, 3 D, 4 GND, 5 Y, 6 Z, 7 B, 8 A

## Slide, SPST
designator Sw?  (value not drawn)
Switch, Slide, SPST, SMD; Manufacturer: C&K; Manufacturer Part Number: SDA01H1SBD; ComponentLink1Description: Datasheet; ComponentLink1URL: C:\Users\Public\Documents\Altium\env\Datasheets\Switch\Slide, SPST - C&K, SDA Series.pdf; ComponentLink2Description: Supplier Link; ComponentLink2URL: https://www.digikey.com/en/products/detail/c-k/SDA01H1SBD/2263273; Supplier: Digikey; Supplier Part Number: CKN10358-ND; Operating Temperature, Min: -40℃; Operating Temperature, Max: +85℃; Quantity, Min: 1; Quantity, Max: 5,000; Price, Min: $1.71000; Supplier Currency: $; Price, Max: $0.92375; Supplier Link: https://www.digikey.com/en/products/detail/c-k/SDA01H1SBD/2263273; Component Type: Slide; Component Category: Switch; Package: SMD
footprint Slide, SPST - C&K, SDA01HxS
pins: A, B

## STM - STM32F417VxTx
designator IC?  Manufacturer Part Number: STM32F417VGT6  Package: QFP-100  (hidden comment: STM - STM32F417VxTx)
IC, MCU, STM32F417VxTx, QFP-100; ComponentLink1Description: Datasheet; ComponentLink1URL: C:\Users\Public\Documents\Altium\env\Datasheets\IC - MCU\STM32F417VxTx.pdf; ComponentLink2Description: Supplier Link; ComponentLink2URL: https://www.digikey.com/en/products/detail/stmicroelectronics/stm32f417vgt6/2757684; Supplier Part Number: 497-11900-ND; Supplier Link: https://www.digikey.com/en/products/detail/stmicroelectronics/stm32f417vgt6/2757684; Supplier Currency: $; Supplier: Digikey; Quantity, Min: 1; Quantity, Max: 1080; Price, Min: $12.09000; Price, Max: $7.40087; Operating Temperature, Min: -40°C; Operating Temperature, Max: +85°C; Manufacturer: STM; Component Type: MCU; Component Category: IC; ComponentLink3Description: Programming Manual; ComponentLink3URL: C:\Users\Public\Documents\Altium\env\Datasheets\IC - MCU\STM32 Cortex - M4 MCUs and MPUs programming manual.pdf
footprint QFP-100, 14mm x 14mm (QFP, 100Pin, 14mm x 14mm, 1.6mm)
part A pins: 23 PA0, 24 PA1, 25 PA2, 26 PA3, 29 PA4, 30 PA5, 31 PA6, 32 PA7, 67 PA8, 68 PA9, 69 PA10, 70 PA11, 71 PA12, 72 PA13, 76 PA14, 77 PA15
part B pins: 35 PB0, 36 PB1, 37 PB2, 47 PB10, 48 PB11, 51 PB12, 52 PB13, 53 PB14, 54 PB15, 89 PB3, 90 PB4, 91 PB5, 92 PB6, 93 PB7, 95 PB8, 96 PB9
part C pins: 7 PC13, 8 PC14, 9 PC15, 15 PC0, 16 PC1, 17 PC2, 18 PC3, 33 PC4, 34 PC5, 63 PC6, 64 PC7, 65 PC8, 66 PC9, 78 PC10, 79 PC11, 80 PC12
part D pins: 55 PD8, 56 PD9, 57 PD10, 58 PD11, 59 PD12, 60 PD13, 61 PD14, 62 PD15, 81 PD0, 82 PD1, 83 PD2, 84 PD3, 85 PD4, 86 PD5, 87 PD6, 88 PD7
part E pins: 1 PE2, 2 PE3, 3 PE4, 4 PE5, 5 PE6, 38 PE7, 39 PE8, 40 PE9, 41 PE10, 42 PE11, 43 PE12, 44 PE13, 45 PE14, 46 PE15, 97 PE0, 98 PE1
part F pins: 6 VBAT, 10 VSS, 11 VDD, 12 PH0, 13 PH1, 14 NRST, 19 VDD, 20 VSSA, 21 VREF+, 22 VDDA, 27 VSS, 28 VDD, 49 VCAP_1, 50 VDD, 73 VCAP_2, 74 VSS, 75 VDD, 94 BOOT0, 99 VSS, 100 VDD

## Tactile, SPST
designator Sw?  (value not drawn)
Switch, Tactile, SPST, SMD; Manufacturer: Panasonic; Manufacturer Part Number: EVQ-Q2K03W; ComponentLink1Description: Datasheet; ComponentLink1URL: C:\Users\Public\Documents\Altium\env\Datasheets\Switch\Tactile, SPST - Panasonic, EVQP0, EVQQ2, EVQ6Q2, EVQ7Q2, EVPBT Series.pdf; ComponentLink2Description: Supplier Link; ComponentLink2URL: https://www.digikey.com/en/products/detail/panasonic-electronic-components/EVQ-Q2K03W/762893; Supplier: Digikey; Supplier Part Number: P12943SCT-ND; Operating Temperature, Min: -40℃; Operating Temperature, Max: +85℃; Quantity, Min: 1; Quantity, Max: 50,000; Price, Min: $0.29000; Supplier Currency: $; Price, Max: $0.13296; Supplier Link: https://www.digikey.com/en/products/detail/panasonic-electronic-components/EVQ-Q2K03W/762893; Component Type: Tactile; Component Category: Switch; Package: SMD
footprint Tactile, SPST - Panasonic, EVQQ2
pins: A, B

## Transformer, Pulse - Bourns, SM13126PEL
designator TR?  Package: SMD, 12.8x6.9 mm  (hidden comment: Transformer, Pulse - Bourns, SM13126PEL)
Transformer, Eth, 100Mbps, SM13126PEL; ComponentLink1Description: Datasheet; ComponentLink1URL: C:\Users\Public\Documents\Altium\env\Datasheets\Transformer\Transformer, Pulse - Bourns, SM51108PEL.pdf; ComponentLink2Description: Supplier Link; ComponentLink2URL: https://www.digikey.com/en/products/detail/bourns-inc/SM13126PEL/10229989; Manufacturer Part Number: SM13126PEL; Supplier: Digikey; Supplier Part Number: SM13126PELCT-ND; Manufacturer: Bourns; Operating Temperature, Min: -40℃; Operating Temperature, Max: +85℃; Quantity, Min: *; Quantity, Max: *; Price, Min: *; Price, Max: *; Supplier Currency: $; Supplier Link: https://www.digikey.com/en/products/detail/bourns-inc/SM13126PEL/10229989; Component Type: Pulse; Component Category: Transformer
footprint Transformer, Pulse - Bourns, SM13126PEL
pins: 1 TD+, 2 CT, 3 TD-, 6 RD+, 7 CT, 8 RD-, 9 RX-, 10 CT, 11 RX+, 14 TX-, 15 CT, 16 TX+

## Voltage Translator, I2C - NXP, NVT2002DP
designator IC?  Manufacturer Part Number: NVT2002DP,118  Package: TSSOP-8  (hidden comment: Voltage Translator, I2C - NXP, NVT2002DP)
IC, Interface, I2C, TSSOP-8; Manufacturer: Nexperia; ComponentLink1Description: Datasheet; ComponentLink1URL: C:\Users\Public\Documents\Altium\env\Datasheets\IC - Interface\Voltage Translator, I2C - NXP, NVT2001, NVT2002.pdf; ComponentLink2Description: Supplier Link; ComponentLink2URL: https://www.digikey.com/en/products/detail/nxp-usa-inc/NVT2002DP-118/2355938; Supplier: Digikey; Supplier Part Number: 568-5121-1-ND; Operating Temperature, Min: +85℃; Operating Temperature, Max: -40℃; Quantity, Min: 1; Quantity, Max: 25,000; Price, Min: $0.62000; Supplier Currency: $; Price, Max: $0.25914; Supplier Link: https://www.digikey.com/en/products/detail/nxp-usa-inc/NVT2002DP-118/2355938; Component Type: Interface; Component Category: IC
footprint TSSOP-8, Body 3mm, Pitch 0.65mm
pins: 1 GND, 2 VREFA, 3 A1, 4 A2, 5 B2, 6 B1, 7 VREFB, 8 EN